# Altium schematic symbol library IC_ADI.SCHLIB: 3169 symbols (part 138 of 181)
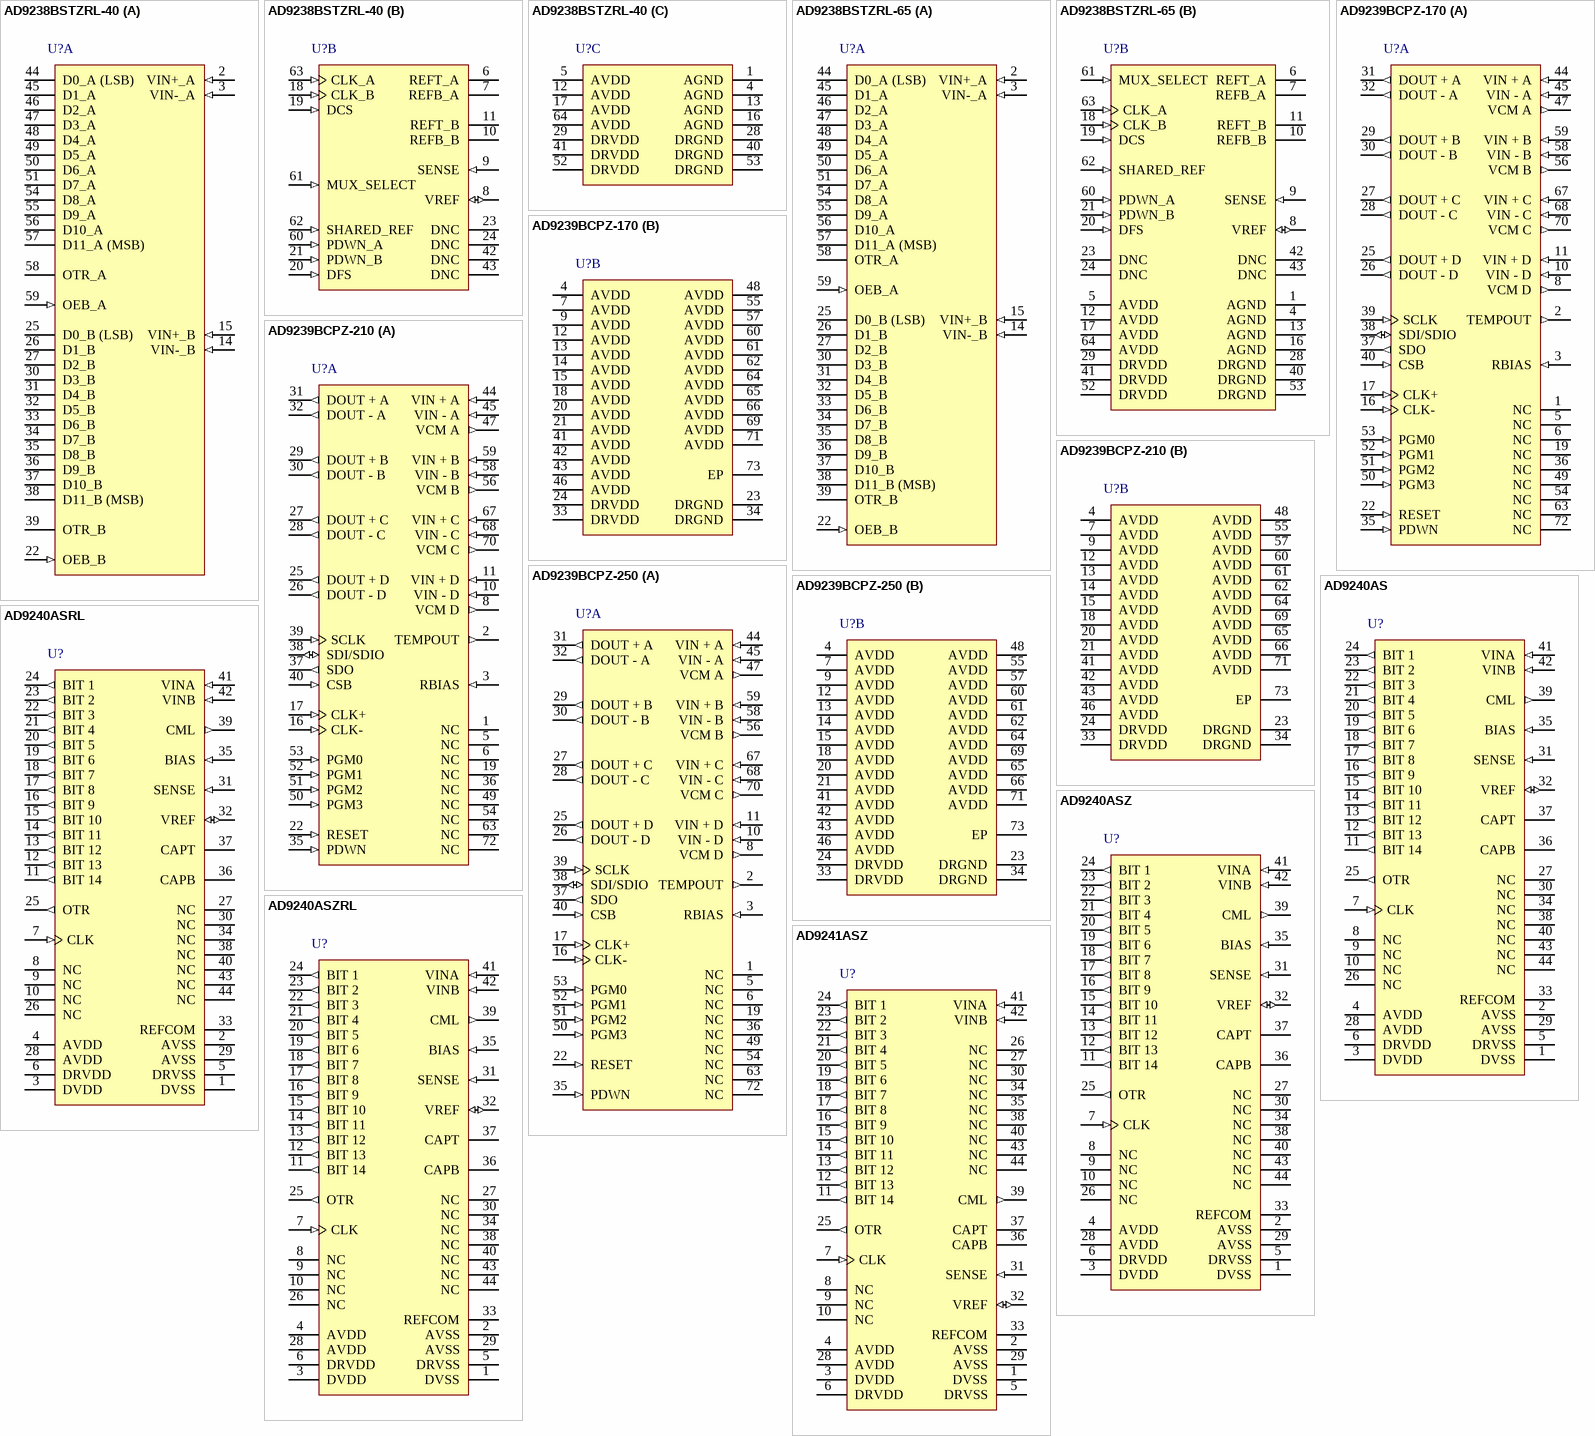
[diagram p328: symbols AD9238BSTZRL-40 to AD9241ASZ]

## AD9239BCPZ-170
designator U?
Quad 12-Bit Analog-to-Digital Converter with Serial Interface, 1.8 V, 170MSPS, 0 to +70 degC, CP-72-3, Pb-Free, Tray; Generic Part Number: AD9239-170; PartNumber: AD9239BCPZ-170; Resolution (Bits): 12; Channels: 4; Throughput Rate (SPS): 170M; Interface: Ser; DatasheetVersion: Rev.B; PackageVersion: 030408-A; PackageReference: CP-72-3; PackageDescription: 72-Lead Lead Frame Chip Scale Package [LFCSP_VQ] 10 x 10 mm Body, Very Thin Quad; Supplier Part Number 1: AD9239BCPZ-170-ND; Supplier Part Number 2: 19P8317; Supplier Part Number 3: 584-AD9239BCPZ-170; RoHS: Y; Packing: Tray; Mounting Technology: Surface Mount; Code_JEDEC: MO-220-VNND-4; ComponentLink1Description: Manufacturer URL; ComponentLink2Description: Datasheet; ComponentLink3Description: Package Specification; ComponentLink4Description: Product URL
footprint QFN72_0.5-PAD(12X12) (Footprint not found)
part A pins: 1 NC "No Connection", 2 TEMPOUT (out) "Output Voltage to Monitor Temperature.", 3 RBIAS (in) "External Resistor to Set the Internal ADC Core Bias Current.", 5 NC "No Connection.", 6 NC "No Connection.", 8 VCM D (out) "Common-Mode Output Voltage Reference", 10 VIN - D (in) "ADC D Analog Complement.", 11 VIN + D (in) "ADC D Analog True.", 16 CLK- (in) "Input Clock Complement.", 17 CLK+ (in) "Input Clock True.", 19 NC "No Connection.", 22 RESET (in) "Digital Output Timing Reset", 25 DOUT + D (out) "ADC D True Digital Output.", 26 DOUT - D (out) "ADC D Complement Digital Output.", 27 DOUT + C (out) "ADC C True Digital Output.", 28 DOUT - C (out) "ADC C Complement Digital Output.", 29 DOUT + B (out) "ADC B True Digital Output.", 30 DOUT - B (out) "ADC B Complement Digital Output.", 31 DOUT + A (out) "ADC A True Digital Output.", 32 DOUT - A (out) "ADC A Complement Digital Output.", 35 PDWN (in) "Power-Down.", 36 NC "No Connection.", 37 SDO (out) "Serial Data Output. Used for 4-wire SPI interface.", 38 SDI/SDIO (io) "Serial Data Input/Serial Data IO for 3-Wire SPI Interface.", 39 SCLK (in) "Serial Clock.", 40 CSB (in) "Chip Select Bar.", 44 VIN + A (in) "ADC A Analog Input True.", 45 VIN - A (in) "ADC A Analog Input Complement.", 47 VCM A (out) "Common-Mode Output Voltage Reference.", 49 NC "No Connection.", 50 PGM3 (in) "Optional Pin to be Programmed by Customer.", 51 PGM2 (in) "Optional Pin to be Programmed by Customer.", 52 PGM1 (in) "Optional Pin to be Programmed by Customer.", 53 PGM0 (in) "Optional Pin to be Programmed by Customer.", 54 NC "No Connection.", 56 VCM B (out) "Common-Mode Output Voltage Reference", 58 VIN - B (in) "ADC B Analog Input Complement.", 59 VIN + B (in) "ADC B Analog Input True.", 63 NC "No Connection.", 67 VIN + C (in) "ADC C Analog Input True.", 68 VIN - C (in) "ADC C Analog Input Complement.", 70 VCM C (out) "Common-Mode Output Voltage Reference.", 72 NC "No Connection"
part B pins: 4 AVDD (power) "1.8 V Analog Supply.", 7 AVDD (power) "1.8 V Analog Supply.", 9 AVDD (power) "1.8 V Analog Supply.", 12 AVDD (power) "1.8 V Analog Supply.", 13 AVDD (power) "1.8 V Analog Supply.", 14 AVDD (power) "1.8 V Analog Supply.", 15 AVDD (power) "1.8 V Analog Supply.", 18 AVDD (power) "1.8 V Analog Supply.", 20 AVDD (power) "1.8 V Analog Supply.", 21 AVDD (power) "1.8 V Analog Supply.", 23 DRGND (power) "Digital Output Driver Ground", 24 DRVDD (power) "1.8 V Digital Output Driver Supply", 33 DRVDD (power) "1.8 V Digital Output Driver Supply", 34 DRGND (power) "Digital Output Driver Ground", 41 AVDD (power) "1.8 V Analog Supply.", 42 AVDD (power) "1.8 V Analog Supply.", 43 AVDD (power) "1.8 V Analog Supply.", 46 AVDD (power) "1.8 V Analog Supply.", 48 AVDD (power) "1.8 V Analog Supply.", 55 AVDD (power) "1.8 V Analog Supply.", 57 AVDD (power) "1.8 V Analog Supply.", 60 AVDD (power) "1.8 V Analog Supply.", 61 AVDD (power) "1.8 V Analog Supply.", 62 AVDD (power) "1.8 V Analog Supply.", 64 AVDD (power) "1.8 V Analog Supply.", 65 AVDD (power) "1.8 V Analog Supply.", 66 AVDD (power) "1.8 V Analog Supply.", 69 AVDD (power) "1.8 V Analog Supply.", 71 AVDD (power) "1.8 V Analog Supply.", 73 EP (power) "Analog Ground (Exposed Paddle)."

## AD9239BCPZ-210
designator U?
Quad 12-Bit Analog-to-Digital Converter with Serial Interface, 1.8 V, 210MSPS, 0 to +70 degC, CP-72-3, Pb-Free, Tray; Generic Part Number: AD9239-210; PartNumber: AD9239BCPZ-210; Resolution (Bits): 12; Channels: 4; Throughput Rate (SPS): 210M; Interface: Ser; DatasheetVersion: Rev.B; PackageVersion: 030408-A; PackageReference: CP-72-3; PackageDescription: 72-Lead Lead Frame Chip Scale Package [LFCSP_VQ] 10 x 10 mm Body, Very Thin Quad; Supplier Part Number 1: AD9239BCPZ-210-ND; Supplier Part Number 2: 19P8318; Supplier Part Number 3: 584-AD9239BCPZ-210; RoHS: Y; Packing: Tray; Mounting Technology: Surface Mount; Code_JEDEC: MO-220-VNND-4; ComponentLink1Description: Manufacturer URL; ComponentLink2Description: Datasheet; ComponentLink3Description: Package Specification; ComponentLink4Description: Product URL
footprint QFN72_0.5-PAD(12X12) (Footprint not found)
part A pins: 1 NC "No Connection.", 2 TEMPOUT (out) "Output Voltage to Monitor Temperature.", 3 RBIAS (in) "External Resistor to Set the Internal ADC Core Bias Current.", 5 NC "No Connection.", 6 NC "No Connection.", 8 VCM D (out) "Common-Mode Output Voltage Reference.", 10 VIN - D (in) "ADC D Analog Complement.", 11 VIN + D (in) "ADC D Analog True.", 16 CLK- (in) "Input Clock Complement.", 17 CLK+ (in) "Input Clock True.", 19 NC "No Connection.", 22 RESET (in) "Digital Output Timing Reset.", 25 DOUT + D (out) "ADC D True Digital Output.", 26 DOUT - D (out) "ADC D Complement Digital Output.", 27 DOUT + C (out) "ADC C True Digital Output.", 28 DOUT - C (out) "ADC C Complement Digital Output.", 29 DOUT + B (out) "ADC B True Digital Output.", 30 DOUT - B (out) "ADC B Complement Digital Output.", 31 DOUT + A (out) "ADC A True Digital Output.", 32 DOUT - A (out) "ADC A Complement Digital Output.", 35 PDWN (in) "Power-Down.", 36 NC "No Connection.", 37 SDO (out) "Serial Data Output. Used for 4-wire SPI interface.", 38 SDI/SDIO (io) "Serial Data Input/Serial Data IO for 3-Wire SPI Interface.", 39 SCLK (in) "Serial Clock.", 40 CSB (in) "Chip Select Bar.", 44 VIN + A (in) "ADC A Analog Input True.", 45 VIN - A (in) "ADC A Analog Input Complement.", 47 VCM A (out) "Common-Mode Output Voltage Reference.", 49 NC "No Connection.", 50 PGM3 (in) "Optional Pin to be Programmed by Customer.", 51 PGM2 (in) "Optional Pin to be Programmed by Customer.", 52 PGM1 (in) "Optional Pin to be Programmed by Customer.", 53 PGM0 (in) "Optional Pin to be Programmed by Customer.", 54 NC "No Connection.", 56 VCM B (out) "Common-Mode Output Voltage Reference.", 58 VIN - B (in) "ADC B Analog Input Complement.", 59 VIN + B (in) "ADC B Analog Input True.", 63 NC "No Connection.", 67 VIN + C (in) "ADC C Analog Input True.", 68 VIN - C (in) "ADC C Analog Input Complement.", 70 VCM C (out) "Common-Mode Output Voltage Reference.", 72 NC "No Connection."
part B pins: 4 AVDD (power) "1.8 V Analog Supply.", 7 AVDD (power) "1.8 V Analog Supply.", 9 AVDD (power) "1.8 V Analog Supply.", 12 AVDD (power) "1.8 V Analog Supply.", 13 AVDD (power) "1.8 V Analog Supply.", 14 AVDD (power) "1.8 V Analog Supply.", 15 AVDD (power) "1.8 V Analog Supply.", 18 AVDD (power) "1.8 V Analog Supply.", 20 AVDD (power) "1.8 V Analog Supply.", 21 AVDD (power) "1.8 V Analog Supply.", 23 DRGND (power) "Digital Output Driver Ground.", 24 DRVDD (power) "1.8 V Digital Output Driver Supply.", 33 DRVDD (power) "1.8 V Digital Output Driver Supply.", 34 DRGND (power) "Digital Output Driver Ground.", 41 AVDD (power) "1.8 V Analog Supply.", 42 AVDD (power) "1.8 V Analog Supply.", 43 AVDD (power) "1.8 V Analog Supply.", 46 AVDD (power) "1.8 V Analog Supply.", 48 AVDD (power) "1.8 V Analog Supply.", 55 AVDD (power) "1.8 V Analog Supply.", 57 AVDD (power) "1.8 V Analog Supply.", 60 AVDD (power) "1.8 V Analog Supply.", 61 AVDD (power) "1.8 V Analog Supply.", 62 AVDD (power) "1.8 V Analog Supply.", 64 AVDD (power) "1.8 V Analog Supply.", 65 AVDD (power) "1.8 V Analog Supply.", 66 AVDD (power) "1.8 V Analog Supply.", 69 AVDD (power) "1.8 V Analog Supply.", 71 AVDD (power) "1.8 V Analog Supply.", 73 EP (power) "Analog Ground (Exposed Paddle)."

## AD9239BCPZ-250
designator U?
Quad 12-Bit Analog-to-Digital Converter with Serial Interface, 1.8 V, 250MSPS, 0 to +70 degC, CP-72-3, Pb-Free, Tray; Generic Part Number: AD9239-250; PartNumber: AD9239BCPZ-250; Resolution (Bits): 12; Channels: 4; Throughput Rate (SPS): 250M; Interface: Ser; DatasheetVersion: Rev.B; PackageVersion: 030408-A; PackageReference: CP-72-3; PackageDescription: 72-Lead Lead Frame Chip Scale Package [LFCSP_VQ] 10 x 10 mm Body, Very Thin Quad; Supplier Part Number 1: AD9239BCPZ-250-ND; Supplier Part Number 2: 19P8319; Supplier Part Number 3: 584-AD9239BCPZ-250; RoHS: Y; Packing: Tray; Mounting Technology: Surface Mount; Code_JEDEC: MO-220-VNND-4; ComponentLink1Description: Manufacturer URL; ComponentLink2Description: Datasheet; ComponentLink3Description: Package Specification; ComponentLink4Description: Product URL
footprint QFN72_0.5-PAD(12X12) (Footprint not found)
part A pins: 1 NC "No Connection.", 2 TEMPOUT (out) "Output Voltage to Monitor Temperature.", 3 RBIAS (in) "External Resistor to Set the Internal ADC Core Bias Current.", 5 NC "No Connection.", 6 NC "No Connection.", 8 VCM D (out) "Common-Mode Output Voltage Reference.", 10 VIN - D (in) "ADC D Analog Complement.", 11 VIN + D (in) "ADC D Analog True.", 16 CLK- (in) "Input Clock Complement.", 17 CLK+ (in) "Input Clock True.", 19 NC "No Connection.", 22 RESET (in) "Digital Output Timing Reset.", 25 DOUT + D (out) "ADC D True Digital Output.", 26 DOUT - D (out) "ADC D Complement Digital Output.", 27 DOUT + C (out) "ADC C True Digital Output.", 28 DOUT - C (out) "ADC C Complement Digital Output.", 29 DOUT + B (out) "ADC B True Digital Output.", 30 DOUT - B (out) "ADC B Complement Digital Output.", 31 DOUT + A (out) "ADC A True Digital Output.", 32 DOUT - A (out) "ADC A Complement Digital Output.", 35 PDWN (in) "Power-Down.", 36 NC "No Connection.", 37 SDO (out) "Serial Data Output. Used for 4-wire SPI interface.", 38 SDI/SDIO (io) "Serial Data Input/Serial Data IO for 3-Wire SPI Interface.", 39 SCLK (in) "Serial Clock.", 40 CSB (in) "Chip Select Bar.", 44 VIN + A (in) "ADC A Analog Input True.", 45 VIN - A (in) "ADC A Analog Input Complement.", 47 VCM A (out) "Common-Mode Output Voltage Reference.", 49 NC "No Connection.", 50 PGM3 (in) "Optional Pin to be Programmed by Customer.", 51 PGM2 (in) "Optional Pin to be Programmed by Customer.", 52 PGM1 (in) "Optional Pin to be Programmed by Customer.", 53 PGM0 (in) "Optional Pin to be Programmed by Customer.", 54 NC "No Connection.", 56 VCM B (out) "Common-Mode Output Voltage Reference.", 58 VIN - B (in) "ADC B Analog Input Complement.", 59 VIN + B (in) "ADC B Analog Input True.", 63 NC "No Connection.", 67 VIN + C (in) "ADC C Analog Input True.", 68 VIN - C (in) "ADC C Analog Input Complement.", 70 VCM C (out) "Common-Mode Output Voltage Reference.", 72 NC "No Connection."
part B pins: 4 AVDD (power) "1.8 V Analog Supply.", 7 AVDD (power) "1.8 V Analog Supply.", 9 AVDD (power) "1.8 V Analog Supply.", 12 AVDD (power) "1.8 V Analog Supply.", 13 AVDD (power) "1.8 V Analog Supply.", 14 AVDD (power) "1.8 V Analog Supply.", 15 AVDD (power) "1.8 V Analog Supply.", 18 AVDD (power) "1.8 V Analog Supply.", 20 AVDD (power) "1.8 V Analog Supply.", 21 AVDD (power) "1.8 V Analog Supply.", 23 DRGND (power) "Digital Output Driver Ground.", 24 DRVDD (power) "1.8 V Digital Output Driver Supply.", 33 DRVDD (power) "1.8 V Digital Output Driver Supply.", 34 DRGND (power) "Digital Output Driver Ground.", 41 AVDD (power) "1.8 V Analog Supply.", 42 AVDD (power) "1.8 V Analog Supply.", 43 AVDD (power) "1.8 V Analog Supply.", 46 AVDD (power) "1.8 V Analog Supply.", 48 AVDD (power) "1.8 V Analog Supply.", 55 AVDD (power) "1.8 V Analog Supply.", 57 AVDD (power) "1.8 V Analog Supply.", 60 AVDD (power) "1.8 V Analog Supply.", 61 AVDD (power) "1.8 V Analog Supply.", 62 AVDD (power) "1.8 V Analog Supply.", 64 AVDD (power) "1.8 V Analog Supply.", 65 AVDD (power) "1.8 V Analog Supply.", 66 AVDD (power) "1.8 V Analog Supply.", 69 AVDD (power) "1.8 V Analog Supply.", 71 AVDD (power) "1.8 V Analog Supply.", 73 EP (power) "Analog Ground (Exposed Paddle)."

## AD9240AS
designator U?
Single 14-Bit Monolithic Analog-to-Digital Converter with Parallel Interface, 10MSPS, -55 to +85 degC, S-44-1, Tray; Generic Part Number: AD9240; PartNumber: AD9240AS; Resolution (Bits): 14; Channels: 1; Throughput Rate (SPS): 10M; Interface: Par; DatasheetVersion: Rev.B; PackageVersion: 041807-A; PackageReference: S-44-1; PackageDescription: 44-Lead Metric Quad Flat Package [MQFP]; Supplier Part Number 1: AD9240AS-ND; Supplier Part Number 2: 584-AD9240AS; RoHS: N; Packing: Tray; Mounting Technology: Surface Mount; Code_JEDEC: MS-022-AB-1; ComponentLink1Description: Manufacturer URL; ComponentLink2Description: Datasheet; ComponentLink3Description: Package Specification; ComponentLink4Description: Product URL
footprint LQFP44_0.8mm (Footprint not found)
pins: 1 DVSS (power) "Digital Ground", 2 AVSS (power) "Analog Ground", 3 DVDD (power) "+5 V Digital Supply", 4 AVDD (power) "+5 V Analog Supply", 5 DRVSS (power) "Digital Output Driver Ground", 6 DRVDD (power) "Digital Output Driver Supply", 7 CLK (in) "Clock Input Pin", 8 NC "No Connect", 9 NC "No Connect", 10 NC "No Connect", 11 BIT 14 (out) "Least Significant Data Bit (LSB)", 12 BIT 13 (out) "Data Output Bits", 13 BIT 12 (out) "Data Output Bits", 14 BIT 11 (out) "Data Output Bits", 15 BIT 10 (out) "Data Output Bits", 16 BIT 9 (out) "Data Output Bits", 17 BIT 8 (out) "Data Output Bits", 18 BIT 7 (out) "Data Output Bits", 19 BIT 6 (out) "Data Output Bits", 20 BIT 5 (out) "Data Output Bits", 21 BIT 4 (out) "Data Output Bits", 22 BIT 3 (out) "Data Output Bits", 23 BIT 2 (out) "Data Output Bits", 24 BIT 1 (out) "Most Significant Data Bit (MSB)", 25 OTR (out) "Out of Range", 26 NC "No Connect", 27 NC "No Connect", 28 AVDD (power) "+5 V Analog Supply", 29 AVSS (power) "Analog Ground", 30 NC "No Connect", 31 SENSE (in) "Reference Select", 32 VREF (io) "Reference I/O", 33 REFCOM (power) "Reference Common", 34 NC "No Connect", 35 BIAS (in) "Power/Speed Programming", 36 CAPB "Noise Reduction Pin", 37 CAPT "Noise Reduction Pin", 38 NC "No Connect", 39 CML (out) "Common-Mode Level (Midsupply)", 40 NC "No Connect", 41 VINA (in) "Analog Input Pin (+)", 42 VINB (in) "Analog Input Pin (-)", 43 NC "No Connect", 44 NC "No Connect"

## AD9240ASRL
designator U?
Single 14-Bit Monolithic Analog-to-Digital Converter with Parallel Interface, 10MSPS, -55 to +85 degC, S-44-1, Reel; Generic Part Number: AD9240; PartNumber: AD9240ASRL; Resolution (Bits): 14; Channels: 1; Throughput Rate (SPS): 10M; Interface: Par; DatasheetVersion: Rev.B; PackageVersion: 041807-A; PackageReference: S-44-1; PackageDescription: 44-Lead Metric Quad Flat Package [MQFP]; Supplier Part Number 1: AD9240ASRL-ND; Supplier Part Number 2: 02H2050; Supplier Part Number 3: 584-AD9240ASR; RoHS: N; Packing: Reel; Mounting Technology: Surface Mount; Code_JEDEC: MS-022-AB-1; ComponentLink1Description: Manufacturer URL; ComponentLink2Description: Datasheet; ComponentLink3Description: Package Specification; ComponentLink4Description: Product URL
footprint LQFP44_0.8mm (Footprint not found)
pins: 1 DVSS (power) "Digital Ground", 2 AVSS (power) "Analog Ground", 3 DVDD (power) "+5 V Digital Supply", 4 AVDD (power) "+5 V Analog Supply", 5 DRVSS (power) "Digital Output Driver Ground", 6 DRVDD (power) "Digital Output Driver Supply", 7 CLK (in) "Clock Input Pin", 8 NC "No Connect", 9 NC "No Connect", 10 NC "No Connect", 11 BIT 14 (out) "Least Significant Data Bit (LSB)", 12 BIT 13 (out) "Data Output Bits", 13 BIT 12 (out) "Data Output Bits", 14 BIT 11 (out) "Data Output Bits", 15 BIT 10 (out) "Data Output Bits", 16 BIT 9 (out) "Data Output Bits", 17 BIT 8 (out) "Data Output Bits", 18 BIT 7 (out) "Data Output Bits", 19 BIT 6 (out) "Data Output Bits", 20 BIT 5 (out) "Data Output Bits", 21 BIT 4 (out) "Data Output Bits", 22 BIT 3 (out) "Data Output Bits", 23 BIT 2 (out) "Data Output Bits", 24 BIT 1 (out) "Most Significant Data Bit (MSB)", 25 OTR (out) "Out of Range", 26 NC "No Connect", 27 NC "No Connect", 28 AVDD (power) "+5 V Analog Supply", 29 AVSS (power) "Analog Ground", 30 NC "No Connect", 31 SENSE (in) "Reference Select", 32 VREF (io) "Reference I/O", 33 REFCOM (power) "Reference Common", 34 NC "No Connect", 35 BIAS (in) "Power/Speed Programming", 36 CAPB "Noise Reduction Pin", 37 CAPT "Noise Reduction Pin", 38 NC "No Connect", 39 CML (out) "Common-Mode Level (Midsupply)", 40 NC "No Connect", 41 VINA (in) "Analog Input Pin (+)", 42 VINB (in) "Analog Input Pin (-)", 43 NC "No Connect", 44 NC "No Connect"

## AD9240ASZ
designator U?
Single 14-Bit Monolithic Analog-to-Digital Converter with Parallel Interface, 10MSPS, -55 to +85 degC, S-44-1, Pb-Free, Tray; Generic Part Number: AD9240; PartNumber: AD9240ASZ; Resolution (Bits): 14; Channels: 1; Throughput Rate (SPS): 10M; Interface: Par; DatasheetVersion: Rev.B; PackageVersion: 041807-A; PackageReference: S-44-1; PackageDescription: 44-Lead Metric Quad Flat Package [MQFP]; Supplier Part Number 1: AD9240ASZ-ND; Supplier Part Number 2: 1651251; Supplier Part Number 3: 1311363; Supplier Part Number 4: 59K7221; Supplier Part Number 5: 584-AD9240ASZ; RoHS: Y; Packing: Tray; Mounting Technology: Surface Mount; Code_JEDEC: MS-022-AB-1; ComponentLink1Description: Manufacturer URL; ComponentLink2Description: Datasheet; ComponentLink3Description: Package Specification; ComponentLink4Description: Product URL
footprint LQFP44_0.8mm (Footprint not found)
pins: 1 DVSS (power) "Digital Ground", 2 AVSS (power) "Analog Ground", 3 DVDD (power) "+5 V Digital Supply", 4 AVDD (power) "+5 V Analog Supply", 5 DRVSS (power) "Digital Output Driver Ground", 6 DRVDD (power) "Digital Output Driver Supply", 7 CLK (in) "Clock Input Pin", 8 NC "No Connect", 9 NC "No Connect", 10 NC "No Connect", 11 BIT 14 (out) "Least Significant Data Bit (LSB)", 12 BIT 13 (out) "Data Output Bits", 13 BIT 12 (out) "Data Output Bits", 14 BIT 11 (out) "Data Output Bits", 15 BIT 10 (out) "Data Output Bits", 16 BIT 9 (out) "Data Output Bits", 17 BIT 8 (out) "Data Output Bits", 18 BIT 7 (out) "Data Output Bits", 19 BIT 6 (out) "Data Output Bits", 20 BIT 5 (out) "Data Output Bits", 21 BIT 4 (out) "Data Output Bits", 22 BIT 3 (out) "Data Output Bits", 23 BIT 2 (out) "Data Output Bits", 24 BIT 1 (out) "Most Significant Data Bit (MSB)", 25 OTR (out) "Out of Range", 26 NC "No Connect", 27 NC "No Connect", 28 AVDD (power) "+5 V Analog Supply", 29 AVSS (power) "Analog Ground", 30 NC "No Connect", 31 SENSE (in) "Reference Select", 32 VREF (io) "Reference I/O", 33 REFCOM (power) "Reference Common", 34 NC "No Connect", 35 BIAS (in) "Power/Speed Programming", 36 CAPB "Noise Reduction Pin", 37 CAPT "Noise Reduction Pin", 38 NC "No Connect", 39 CML (out) "Common-Mode Level (Midsupply)", 40 NC "No Connect", 41 VINA (in) "Analog Input Pin (+)", 42 VINB (in) "Analog Input Pin (-)", 43 NC "No Connect", 44 NC "No Connect"

## AD9240ASZRL
designator U?
Single 14-Bit Monolithic Analog-to-Digital Converter with Parallel Interface, 10MSPS, -55 to +85 degC, S-44-1, Pb-Free, Reel; Generic Part Number: AD9240; PartNumber: AD9240ASZRL; Resolution (Bits): 14; Channels: 1; Throughput Rate (SPS): 10M; Interface: Par; DatasheetVersion: Rev.B; PackageVersion: 041807-A; PackageReference: S-44-1; PackageDescription: 44-Lead Metric Quad Flat Package [MQFP]; Supplier Part Number 1: AD9240ASZRLTR-ND; Supplier Part Number 2: AD9240ASZRLCT-ND; Supplier Part Number 3: AD9240ASZRLDKR-ND; Supplier Part Number 4: 59K7222; Supplier Part Number 5: 584-AD9240ASZR; RoHS: Y; Packing: Reel; Mounting Technology: Surface Mount; Code_JEDEC: MS-022-AB-1; ComponentLink1Description: Manufacturer URL; ComponentLink2Description: Datasheet; ComponentLink3Description: Package Specification; ComponentLink4Description: Product URL
footprint LQFP44_0.8mm (Footprint not found)
pins: 1 DVSS (power) "Digital Ground", 2 AVSS (power) "Analog Ground", 3 DVDD (power) "+5 V Digital Supply", 4 AVDD (power) "+5 V Analog Supply", 5 DRVSS (power) "Digital Output Driver Ground", 6 DRVDD (power) "Digital Output Driver Supply", 7 CLK (in) "Clock Input Pin", 8 NC "No Connect", 9 NC "No Connect", 10 NC "No Connect", 11 BIT 14 (out) "Least Significant Data Bit (LSB)", 12 BIT 13 (out) "Data Output Bits", 13 BIT 12 (out) "Data Output Bits", 14 BIT 11 (out) "Data Output Bits", 15 BIT 10 (out) "Data Output Bits", 16 BIT 9 (out) "Data Output Bits", 17 BIT 8 (out) "Data Output Bits", 18 BIT 7 (out) "Data Output Bits", 19 BIT 6 (out) "Data Output Bits", 20 BIT 5 (out) "Data Output Bits", 21 BIT 4 (out) "Data Output Bits", 22 BIT 3 (out) "Data Output Bits", 23 BIT 2 (out) "Data Output Bits", 24 BIT 1 (out) "Most Significant Data Bit (MSB)", 25 OTR (out) "Out of Range", 26 NC "No Connect", 27 NC "No Connect", 28 AVDD (power) "+5 V Analog Supply", 29 AVSS (power) "Analog Ground", 30 NC "No Connect", 31 SENSE (in) "Reference Select", 32 VREF (io) "Reference I/O", 33 REFCOM (power) "Reference Common", 34 NC "No Connect", 35 BIAS (in) "Power/Speed Programming", 36 CAPB "Noise Reduction Pin", 37 CAPT "Noise Reduction Pin", 38 NC "No Connect", 39 CML (out) "Common-Mode Level (Midsupply)", 40 NC "No Connect", 41 VINA (in) "Analog Input Pin (+)", 42 VINB (in) "Analog Input Pin (-)", 43 NC "No Connect", 44 NC "No Connect"

## AD9241ASZ
designator U?
Single 14-Bit Monolithic Analog-to-Digital Converter with Parallel Interface, 1.25MSPS, -40 to +85 degC, S-44-1, Pb-Free, Tray; Generic Part Number: AD9241; PartNumber: AD9241ASZ; Resolution (Bits): 14; Channels: 1; Throughput Rate (SPS): 1.25M; Interface: Par; DatasheetVersion: Rev.0; PackageVersion: 041807-A; PackageReference: S-44-1; PackageDescription: 44-Lead Metric Quad Flat Package [MQFP]; Supplier Part Number 1: AD9241ASZ-ND; Supplier Part Number 2: 2305581; Supplier Part Number 3: 59K7224; Supplier Part Number 4: 584-AD9241ASZ; RoHS: Y; Packing: Tray; Mounting Technology: Surface Mount; Code_JEDEC: MS-022-AB-1; ComponentLink1Description: Manufacturer URL; ComponentLink2Description: Datasheet; ComponentLink3Description: Package Specification; ComponentLink4Description: Product URL
footprint LQFP44_0.8mm (Footprint not found)
pins: 1 DVSS (power) "Digital Ground", 2 AVSS (power) "Analog Ground", 3 DVDD (power) "+5 V Digital Supply", 4 AVDD (power) "+5 V Analog Supply", 5 DRVSS (power) "Digital Output Driver Ground", 6 DRVDD (power) "Digital Output Driver Supply", 7 CLK (in) "Clock Input Pin", 8 NC "No Connect", 9 NC "No Connect", 10 NC "No Connect", 11 BIT 14 (out) "Least Significant Data Bit (LSB)", 12 BIT 13 (out) "Data Output Bit", 13 BIT 12 (out) "Data Output Bit", 14 BIT 11 (out) "Data Output Bit", 15 BIT 10 (out) "Data Output Bit", 16 BIT 9 (out) "Data Output Bit", 17 BIT 8 (out) "Data Output Bit", 18 BIT 7 (out) "Data Output Bit", 19 BIT 6 (out) "Data Output Bit", 20 BIT 5 (out) "Data Output Bit", 21 BIT 4 (out) "Data Output Bit", 22 BIT 3 (out) "Data Output Bit", 23 BIT 2 (out) "Data Output Bit", 24 BIT 1 (out) "Most Significant Data Bit (MSB)", 25 OTR (out) "Out of Range", 26 NC "No Connect", 27 NC "No Connect", 28 AVDD (power) "+5 V Analog Supply", 29 AVSS (power) "Analog Ground", 30 NC "No Connect", 31 SENSE (in) "Reference Select", 32 VREF (io) "Reference I/O", 33 REFCOM (power) "Reference Common", 34 NC "No Connect", 35 NC "No Connect", 36 CAPB "Noise Reduction Pin", 37 CAPT "Noise Reduction Pin", 38 NC "No Connect", 39 CML (out) "Common-Mode Level (Midsupply)", 40 NC "No Connect", 41 VINA (in) "Analog Input Pin (+)", 42 VINB (in) "Analog Input Pin (-)", 43 NC "No Connect", 44 NC "No Connect"

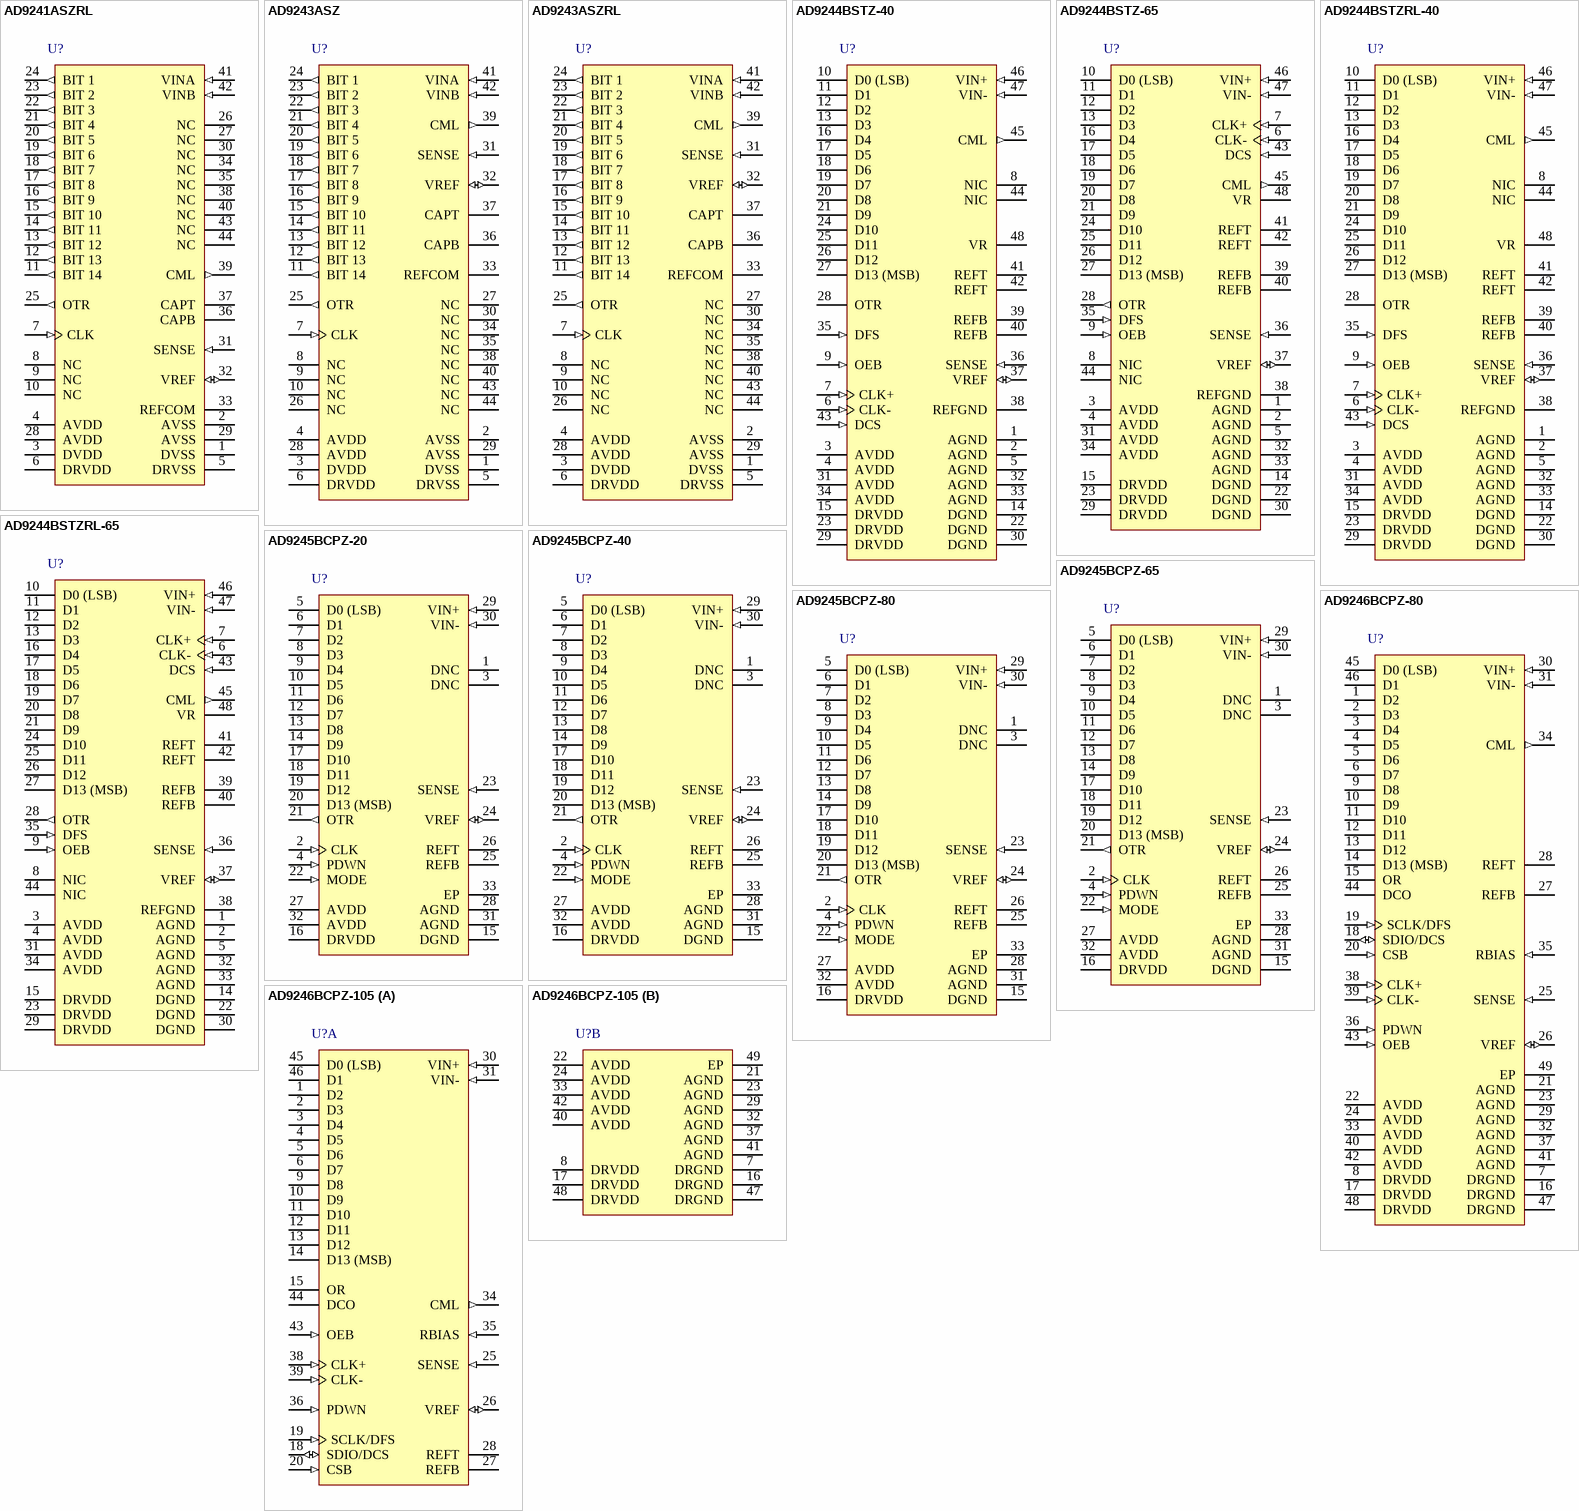
[diagram p114: symbols AD9241ASZRL to AD9246BCPZ-105]

## AD9241ASZRL
designator U?
Single 14-Bit Monolithic Analog-to-Digital Converter with Parallel Interface, 1.25MSPS, 0 to +70 degC, S-44-1, Pb-Free, Reel; Generic Part Number: AD9241; PartNumber: AD9241ASZRL; Resolution (Bits): 14; Channels: 1; Throughput Rate (SPS): 1.25M; Interface: Par; DatasheetVersion: Rev.0; PackageVersion: 041807-A; PackageReference: S-44-1; PackageDescription: 44-Lead Metric Quad Flat Package [MQFP]; Supplier Part Number 1: AD9241ASZRL-ND; Supplier Part Number 2: 584-AD9241ASZR; RoHS: Y; Packing: Reel; Mounting Technology: Surface Mount; Code_JEDEC: MS-022-AB-1; ComponentLink1Description: Manufacturer URL; ComponentLink2Description: Datasheet; ComponentLink3Description: Package Specification; ComponentLink4Description: Product URL
footprint LQFP44_0.8mm (Footprint not found)
pins: 1 DVSS (power) "Digital Ground", 2 AVSS (power) "Analog Ground", 3 DVDD (power) "+5 V Digital Supply", 4 AVDD (power) "+5 V Analog Supply", 5 DRVSS (power) "Digital Output Driver Ground", 6 DRVDD (power) "Digital Output Driver Supply", 7 CLK (in) "Clock Input Pin", 8 NC "No Connect", 9 NC "No Connect", 10 NC "No Connect", 11 BIT 14 (out) "Least Significant Data Bit (LSB)", 12 BIT 13 (out) "Data Output Bit", 13 BIT 12 (out) "Data Output Bit", 14 BIT 11 (out) "Data Output Bit", 15 BIT 10 (out) "Data Output Bit", 16 BIT 9 (out) "Data Output Bit", 17 BIT 8 (out) "Data Output Bit", 18 BIT 7 (out) "Data Output Bit", 19 BIT 6 (out) "Data Output Bit", 20 BIT 5 (out) "Data Output Bit", 21 BIT 4 (out) "Data Output Bit", 22 BIT 3 (out) "Data Output Bit", 23 BIT 2 (out) "Data Output Bit", 24 BIT 1 (out) "Most Significant Data Bit (MSB)", 25 OTR (out) "Out of Range", 26 NC "No Connect", 27 NC "No Connect", 28 AVDD (power) "+5 V Analog Supply", 29 AVSS (power) "Analog Ground", 30 NC "No Connect", 31 SENSE (in) "Reference Select", 32 VREF (io) "Reference I/O", 33 REFCOM (power) "Reference Common", 34 NC "No Connect", 35 NC "No Connect", 36 CAPB "Noise Reduction Pin", 37 CAPT "Noise Reduction Pin", 38 NC "No Connect", 39 CML (out) "Common-Mode Level (Midsupply)", 40 NC "No Connect", 41 VINA (in) "Analog Input Pin (+)", 42 VINB (in) "Analog Input Pin (-)", 43 NC "No Connect", 44 NC "No Connect"